# Altium footprint library Connectors.PcbLib: 122 footprints (part 5 of 8)
Each footprint in its own frame and in the unit in brackets; x right, y up, seen from the top. Pads: shape width x height; smd on the part's side, far side on the other; paste and mask are expansions set on the pad; w line width, h text height; cw(c..) or ccw(c..) is an arc to the next point about the centre after c.
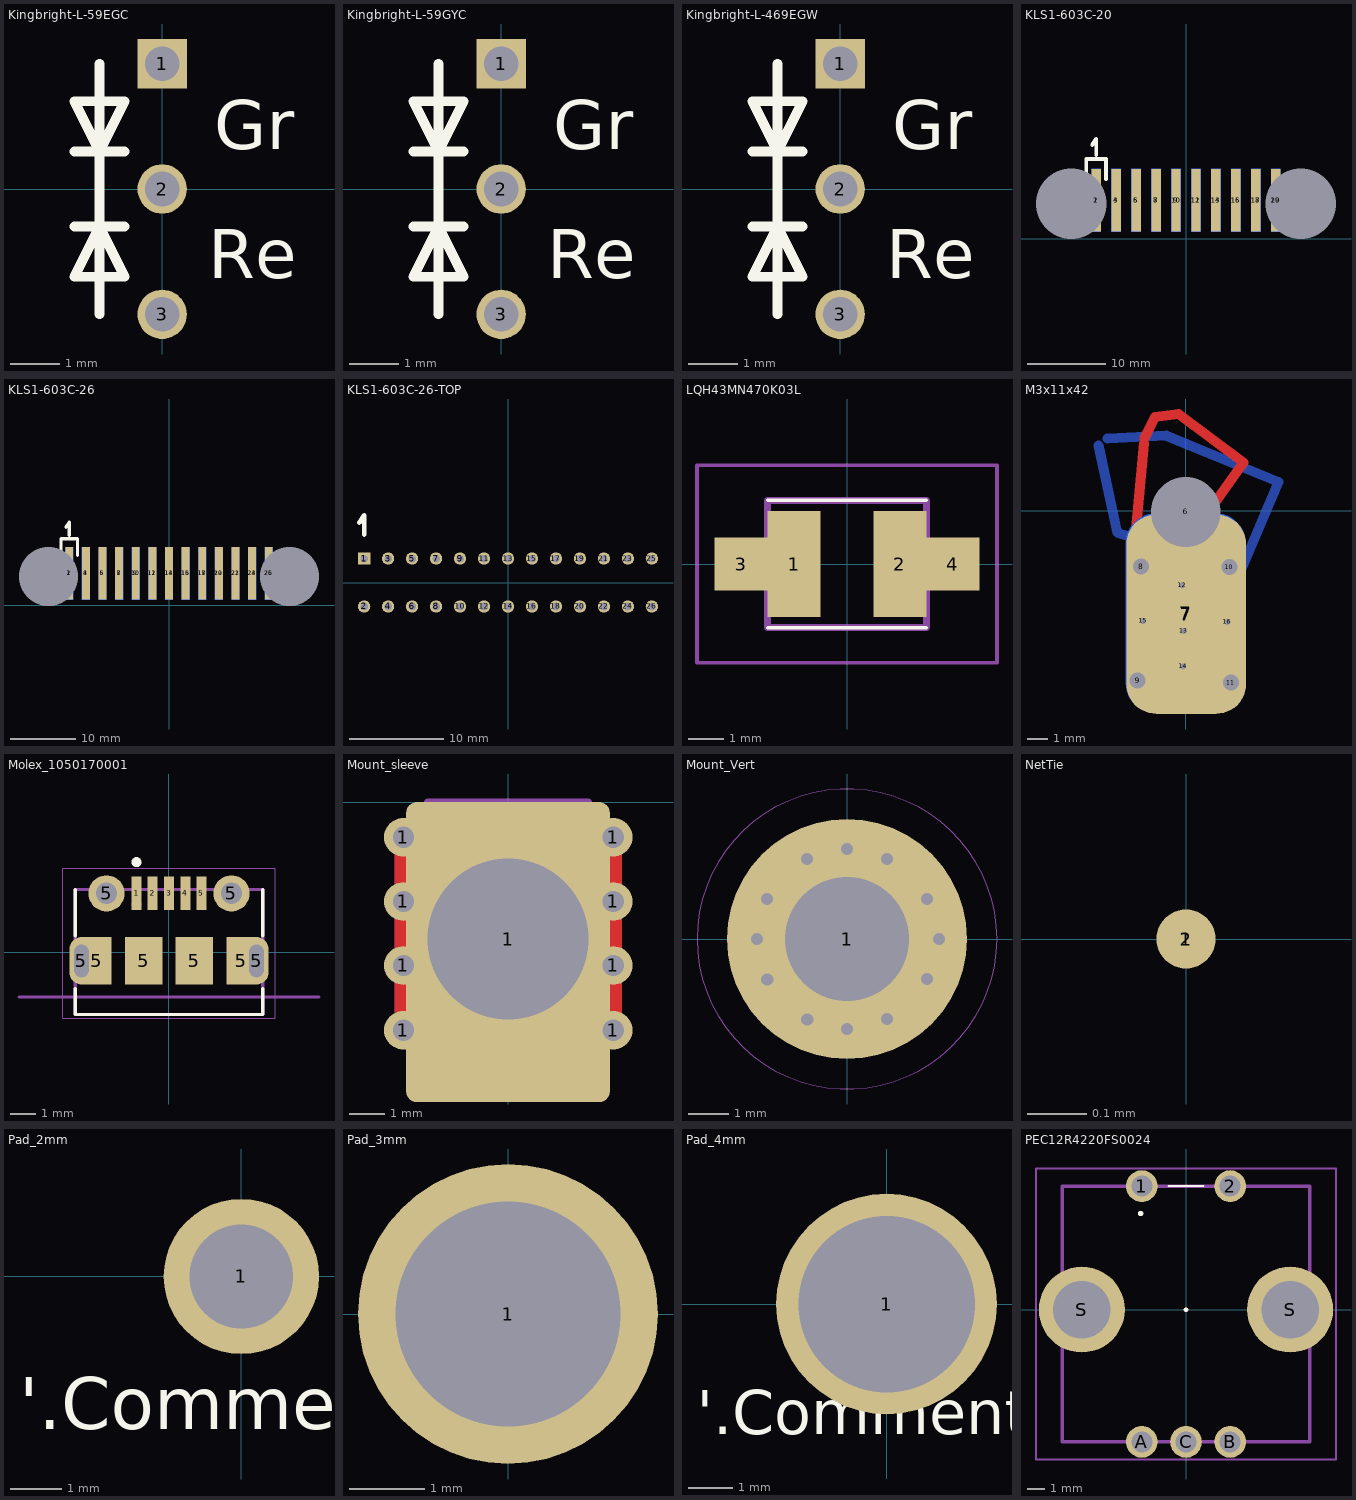
[diagram p4: the footprints below, top view; thin cyan lines are the x and y axes]

## Kingbright-L-59EGC [mm] "Kingbright-Dual-LED-r/g"
pads (3):
  rect 1.001x1.001 hole 0.7: 1(0,2.54)
  round 1.001 hole 0.7: 2(0,0) 3(0,-2.54)
Top Overlay:
  lines w0.2: -1.778,-0.762 -0.762,-0.762 ; -1.778,0.762 -0.762,0.762 ; -1.27,-2.54 -1.27,0 -1.27,2.54 ; -1.778,-1.778 -1.27,-0.762 -0.762,-1.778 -1.778,-1.778 ; -1.778,1.778 -0.762,1.778 -1.27,0.762 -1.778,1.778
  text "Re" at 0.932,-1.812 h1
  text "Gr" at 1.053,0.809 h1
3D body "Kingbright-L-59EGC.STEP": height 13.6, standoff -19.5, extent -2.95,-2.947 2.5,2.947

## Kingbright-L-59GYC [mm] "Kingbright-Dual-LED-y/g"
pads (3):
  rect 1.001x1.001 hole 0.7: 1(0,2.54)
  round 1.001 hole 0.7: 2(0,0) 3(0,-2.54)
Top Overlay:
  lines w0.2: -1.778,-0.762 -0.762,-0.762 ; -1.778,0.762 -0.762,0.762 ; -1.27,-2.54 -1.27,0 -1.27,2.54 ; -1.778,-1.778 -1.27,-0.762 -0.762,-1.778 -1.778,-1.778 ; -1.778,1.778 -0.762,1.778 -1.27,0.762 -1.778,1.778
  text "Re" at 0.932,-1.812 h1
  text "Gr" at 1.053,0.809 h1
3D body "Kingbright-L-59GYC.STEP": height 13.6, standoff -19.5, extent -2.95,-2.947 2.5,2.947

## Kingbright-L-469EGW [mm] "Kingbright-Dual-LED-r/g"
pads (3):
  rect 1.001x1.001 hole 0.7: 1(0,2.54)
  round 1.001 hole 0.7: 2(0,0) 3(0,-2.54)
Top Overlay:
  lines w0.2: -1.778,-0.762 -0.762,-0.762 ; -1.778,0.762 -0.762,0.762 ; -1.27,-2.54 -1.27,0 -1.27,2.54 ; -1.778,-1.778 -0.762,-1.778 -1.27,-0.762 -1.778,-1.778 ; -1.778,1.778 -1.27,0.762 -0.762,1.778 -1.778,1.778
  text "Gr" at 1.053,0.809 h1
  text "Re" at 0.932,-1.812 h1
3D body "Kingbright-L-469EGW.STEP": height 12.1, standoff -19.5, extent -2.75,-2.89 2.75,2.89

## KLS1-603C-20 [mm]
pads (22):
  rect 1.2x8 smd: 1(-11.43,4.89) 3(-8.89,4.89) 5(-6.35,4.89) 7(-3.81,4.89) 9(-1.27,4.89) 11(1.27,4.89) 13(3.81,4.89) 15(6.35,4.89) 17(8.89,4.89) 19(11.43,4.89)
  rect 1.2x8 smd far side: 2(-11.43,4.89) 4(-8.89,4.89) 6(-6.35,4.89) 8(-3.81,4.89) 10(-1.27,4.89) 12(1.27,4.89) 14(3.81,4.89) 16(6.35,4.89) 18(8.89,4.89) 20(11.43,4.89)
  round 0 hole 9 square unplated: 11(-14.6,4.44) 11(14.6,4.44)
Top Overlay:
  lines w0.5: -12.7,7.62 -12.7,10.16 -10.16,10.16 -10.16,7.62 ; -11.938,11.938 -11.43,12.7 -11.43,10.668
Bottom Overlay:
  lines w0.5: -12.7,7.62 -12.7,10.16 -10.16,10.16 -10.16,7.62 ; -12.192,10.668 -10.668,10.668 -12.192,12.192 -12.192,12.7 -10.668,12.7
3D body "KLS1-603C.STEP": height 5.05, standoff -4.55, extent -15.24,-11.11 15.24,8.89

## KLS1-603C-26 [mm]
pads (28):
  rect 1.2x8 smd: 1(-15.24,4.89) 3(-12.7,4.89) 5(-10.16,4.89) 7(-7.62,4.89) 9(-5.08,4.89) 11(-2.54,4.89) 13(0,4.89) 15(2.54,4.89) 17(5.08,4.89) 19(7.62,4.89) 21(10.16,4.89) 23(12.7,4.89) 25(15.24,4.89)
  rect 1.2x8 smd far side: 2(-15.24,4.89) 4(-12.7,4.89) 6(-10.16,4.89) 8(-7.62,4.89) 10(-5.08,4.89) 12(-2.54,4.89) 14(0,4.89) 16(2.54,4.89) 18(5.08,4.89) 20(7.62,4.89) 22(10.16,4.89) 24(12.7,4.89) 26(15.24,4.89)
  round 0 hole 9 square unplated: 11(-18.41,4.44) 11(18.41,4.44)
Top Overlay:
  lines w0.5: -16.51,7.62 -16.51,10.16 -13.97,10.16 -13.97,7.62 ; -15.748,11.938 -15.24,12.7 -15.24,10.668
Bottom Overlay:
  lines w0.5: -16.51,7.62 -16.51,10.16 -13.97,10.16 -13.97,7.62 ; -16.002,10.668 -14.478,10.668 -16.002,12.192 -16.002,12.7 -14.478,12.7
3D body "KLS1-603C-26.STEP": height 5.05, standoff -4.55, extent -19.05,-11.11 19.049,8.89

## KLS1-603C-26-TOP [mm]
pads (26):
  rect 1.3x1.3 hole 0.8: 1(-15.24,2.54)
  round 1.3 hole 0.8: 2(-15.24,-2.54) 3(-12.7,2.54) 4(-12.7,-2.54) 5(-10.16,2.54) 6(-10.16,-2.54) 7(-7.62,2.54) 8(-7.62,-2.54) 9(-5.08,2.54) 10(-5.08,-2.54) 11(-2.54,2.54) 12(-2.54,-2.54) 13(0,2.54) 14(0,-2.54) 15(2.54,2.54) 16(2.54,-2.54) 17(5.08,2.54) 18(5.08,-2.54) 19(7.62,2.54) 20(7.62,-2.54) 21(10.16,2.54) 22(10.16,-2.54) 23(12.7,2.54) 24(12.7,-2.54) 25(15.24,2.54) 26(15.24,-2.54)
Top Overlay:
  lines w0.5: -15.748,6.35 -15.24,7.112 -15.24,5.08
3D body "KLS1-603C-26.STEP": height 15.8, standoff -4.2, extent -19.05,-4.8 19.05,4.8

## LQH43MN470K03L [mm]
pads (4):
  rect 1.5x3 smd: 1(-1.5,0) 2(1.5,0)
  rect 1.5x1.5 smd: 3(-3,0) 4(3,0)
Top Overlay:
  lines w0.1: -2.25,-1.8 2.25,-1.8 ; -2.25,1.8 2.25,1.8
Mechanical 13:
  lines w0.2: -2.25,-1.8 2.25,-1.8 2.25,1.8 -2.25,1.8 -2.25,-1.8
Mechanical 15:
  lines w0.1: -4.25,-2.8 4.25,-2.8 4.25,2.8 -4.25,2.8 -4.25,-2.8
3D body "LQH43MN1R0M03L.stp": height 2.8, standoff 0, extent -2.25,-1.9 2.25,1.9

## M3x11x42 [mm]
pads (12):
  round 0.5 hole 3.5 unplated: 6(0,-0.051)
  rrect50% 6x10 smd far side: 7(0,-5.131)
  rrect50% 6x10 smd: 7(0.025,-5.182)
  round 0.5 hole 0.8: 8(-2.235,-2.794) 9(-2.413,-8.509) 10(2.184,-2.819) 11(2.261,-8.611)
  round 0.5 hole 0.301: 12(-0.178,-3.734) 13(-0.102,-6.02) 14(-0.127,-7.798) 15(-2.134,-5.512) 16(2.083,-5.563)
Top Layer:
  lines w0.5: -2.083,3.378 -2.489,-0.914 -0.102,-1.778 2.896,2.413 -0.356,4.851 -1.549,4.699 -2.057,3.658
  text "TOP" at -0.559,1.93 h1
Bottom Layer:
  lines w0.5: -4.369,3.277 -3.429,-1.092 2.743,-3.048 4.648,1.448 -0.975,3.763 -3.915,3.621
  text "bot" at -3.581,2.515 h1
3D body "Колодка_M3x11x42.STEP": height 6, standoff -6, extent -2.758,-8.392 2.642,3.008

## Molex_1050170001 [mm] "uUSB"
pads (13):
  rect 0.4x1.35 smd: 1(-1.3,2.348) 2(-0.65,2.348) 3(0,2.348) 4(0.65,2.348) 5(1.3,2.348)
  oval 0.95x1.9 hole 0.6 slot 1.3 at 90 deg: 5(-3.5,-0.352) 5(3.5,-0.352)
  rect 1.2x1.9 smd: 5(-2.9,-0.352) 5(2.9,-0.352)
  round 1.45 hole 0.85: 5(-2.5,2.348) 5(2.5,2.348)
  rect 1.5x1.9 smd: 5(-1,-0.352) 5(1,-0.352)
Top Overlay:
  circle w0.2: c-1.3,3.598 r0.1
  lines w0.127: -3.75,-1.452 -3.75,-2.502 3.75,-2.502 3.75,-1.452 ; -3.75,0.648 -3.75,2.498 ; 3.75,0.648 3.75,2.498
Mechanical 13:
  circle w0.2: c-1.3,1.898 r0.1
  lines w0.127: -6,-1.802 -3.75,-1.802 ; -3.75,-2.502 3.75,-2.502 3.75,-1.802 ; -3.75,-2.452 -3.75,-1.802 ; 6,-1.802 3.75,-1.802 ; -3.75,-1.802 3.75,-1.802 ; -3.75,-1.802 -3.75,2.498 3.75,2.498 3.75,-1.802
  text "PCB EDGE" at -1.599,-2.35 h0.41
Mechanical 15:
  lines w0.05: -4.25,-2.652 -4.25,3.348 4.25,3.348 4.25,-2.652 -4.25,-2.652
3D body "Molex_1050170001.stp": height 2.68, standoff -0.63, extent -4.1,-2.75 4.1,2.65

## Mount_sleeve [mm] "1,5 mm offset, 6mm length, 5 mm dia"
pads (9):
  round 1.1 hole 0.601: 1(-2.983,-6.5) 1(-2.983,-4.655) 1(-2.983,-2.831) 1(-2.983,-1) 1(3,-6.5) 1(3,-4.655) 1(3,-2.831) 1(3,-1)
  rrect10% 5.8x8.55 hole 4.6 square copper offset 0,-0.375: 1(0,-3.9)
Top Layer:
  lines w0.5: -3,-6.5 3,-6.5 ; -2.983,-6.55 -2.983,-1.051 ; 3,-6.55 3,-1.051
Bottom Layer:
  lines w0.5: -3,-6.5 3,-6.5 ; -2.983,-6.55 -2.983,-1.051 ; 3,-6.55 3,-1.051
Mechanical 3:
  lines w0.2: -2.3,-7.8 -2.3,0 2.3,0 2.3,-7.8 -2.297,-7.8 -2.3,-7.797 ; -2.301,-7.797 -2.3,-7.797
3D body "Стойка_6мм_кр_5мм.STEP": height 3.5, standoff -1.5, extent -2.5,-6 2.5,0

## Mount_Vert [mm] "1,5 mm offset, 6mm length, 5 mm dia"
pads (1):
  round 6 hole 3.1: 1(0,0)
via -1.994,-1.018 diameter 0.601 hole 0.301
via -0.994,-2.018 diameter 0.601 hole 0.301
via 2,1 diameter 0.601 hole 0.301
via 1,2 diameter 0.601 hole 0.301
via 1,-2 diameter 0.601 hole 0.301
via 2,-1 diameter 0.601 hole 0.301
via -1,2 diameter 0.601 hole 0.301
via -2,1 diameter 0.601 hole 0.301
via 2.296,-0.003 diameter 0.601 hole 0.301
via 0,-2.25 diameter 0.601 hole 0.301
via -2.25,0 diameter 0.601 hole 0.301
via 0,2.25 diameter 0.601 hole 0.301
Mechanical 3:
  circle w0.01: c0,0 r3.75
3D body "Стойка_6мм_кр_5мм.STEP": height 6, standoff 0, extent -2.5,-2.5 2.5,2.5

## NetTie [mm]
pads (2):
  round 0.1 smd paste-2539.97 mask+0.102: 1(0,0)
  round 0.1 smd paste-2539.97 mask+0: 2(0,0)

## Pad_2mm [mm]
pads (1):
  round 3 hole 2: 1(0,0)
Top Overlay:
  text "'.Comment'" at -4.295,-2.949 h1
Bottom Overlay:
  text "'.Comment'" at 4.376,2.414 h1

## Pad_3mm [mm]
pads (1):
  round 4 hole 3: 1(0,0)

## Pad_4mm [mm]
pads (1):
  round 5 hole 4: 1(0,0)
Top Overlay:
  text "'.Comment'" at -4.295,-2.949 h1
Bottom Overlay:
  text "'.Comment'" at 4.376,2.414 h1

## PEC12R4220FS0024 [mm]
pads (7):
  round 1.8 hole 1.2: 1(-2.5,7) 2(2.5,7) A(-2.5,-7.5) B(2.5,-7.5) C(0,-7.5)
  round 4.875 hole 3.25: S(-5.9,0) S(5.9,0)
Top Overlay:
  lines w0.1: -1,7 1,7
  lines w0.2: -2.618,5.443 ccw(c-2.568,5.443) -2.518,5.443 ccw(c-2.568,5.443) -2.618,5.443
  lines w0.254: -0.01,0 0.01,0
Mechanical 13:
  lines w0.2: -7,-7.5 7,-7.5 7,7 -7,7 -7,-7.5
Mechanical 15:
  lines w0.1: -8.5,-8.5 8.5,-8.5 8.5,8 -8.5,8 -8.5,-8.5
3D body "PEC11R-4115F-S0018.STEP": height 21.5, standoff -3.7, extent -6.998,-7.5 6.998,7